# Altium footprint library BaseLib.PcbLib: 62 footprints (part 2 of 4)
Each footprint in its own frame and in the unit in brackets; x right, y up, seen from the top. Pads: shape width x height; smd on the part's side, far side on the other; paste and mask are expansions set on the pad; w line width, h text height; cw(c..) or ccw(c..) is an arc to the next point about the centre after c.
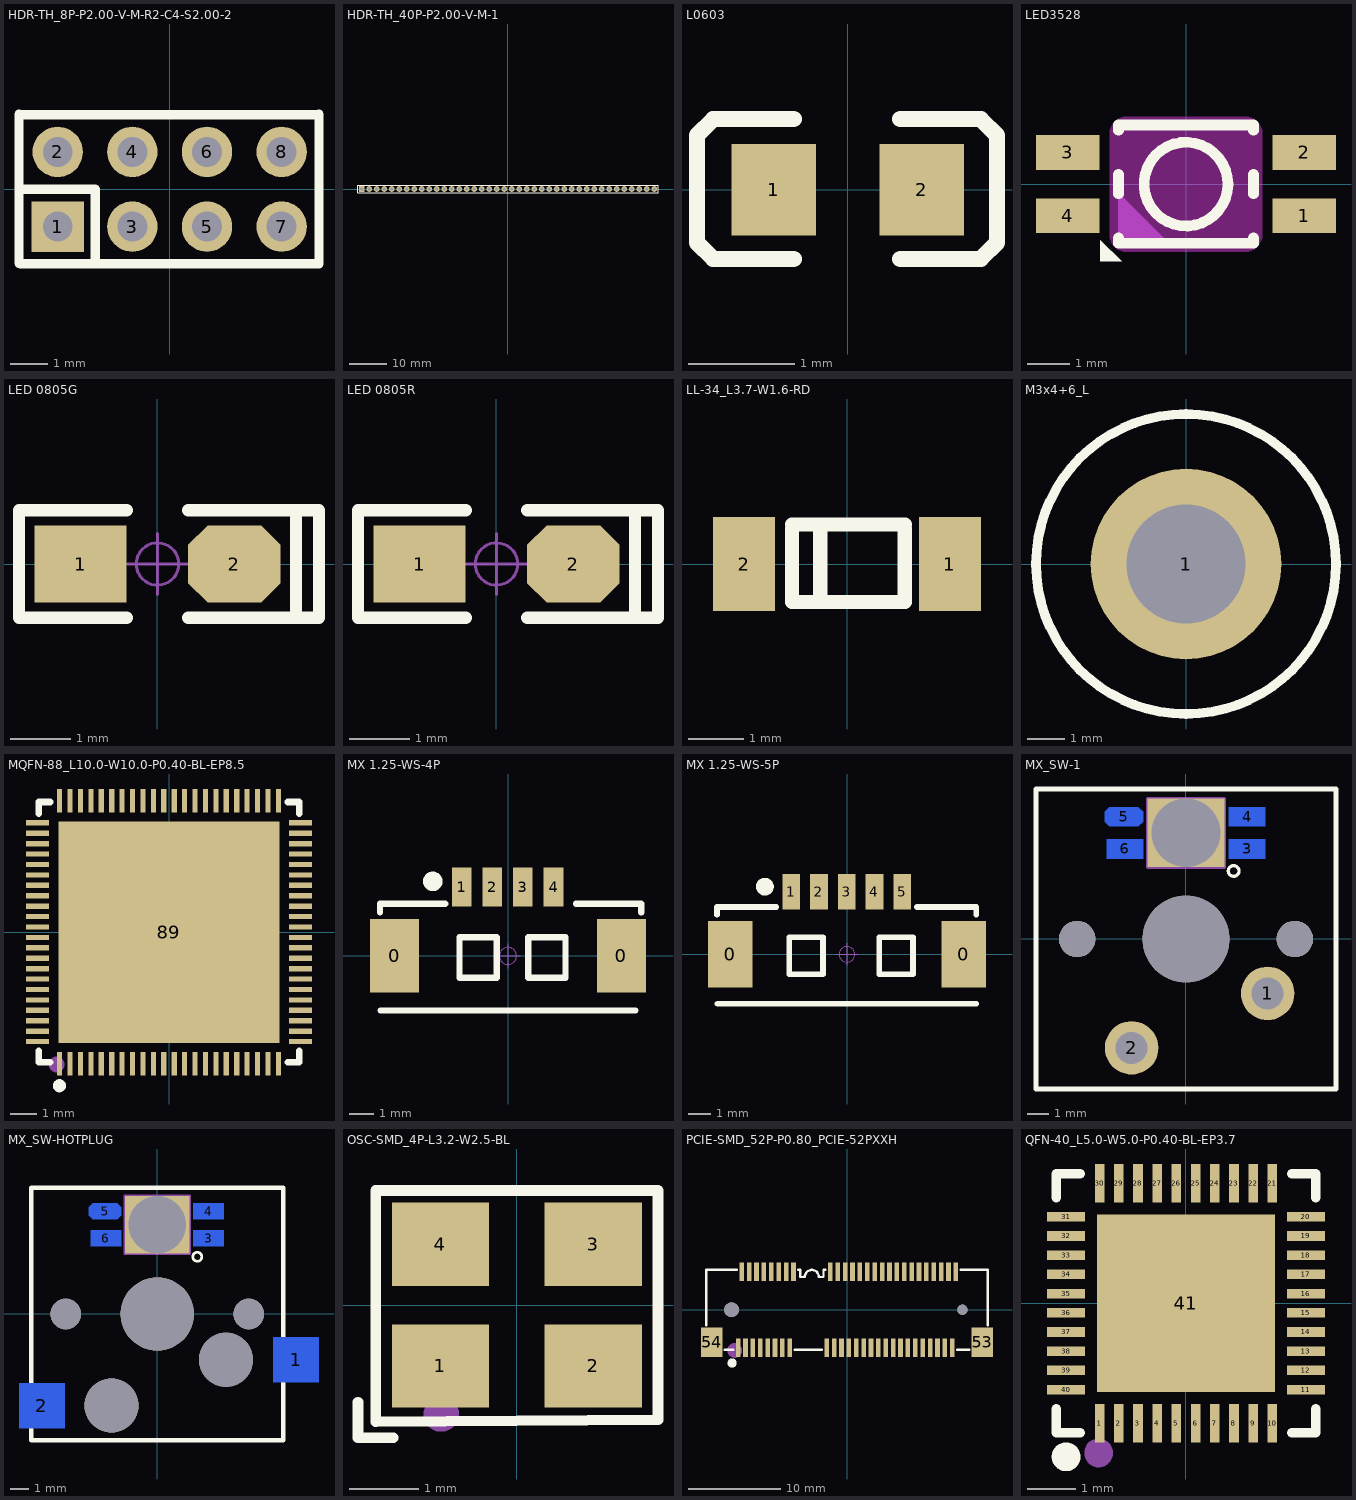
[diagram p1: the footprints below, top view; thin cyan lines are the x and y axes]

## HDR-TH_8P-P2.00-V-M-R2-C4-S2.00-2 [mm]
pads (8):
  rect 1.4x1.35 hole 0.8: 1(-3,-1)
  round 1.35 hole 0.8: 2(-3,1) 3(-1,-1) 4(-1,1) 5(1,-1) 6(1,1) 7(3,-1) 8(3,1)
Top Overlay:
  lines w0.254: -4.038,-1.989 -4.038,2.011 ; -4,-1.999 4,-1.999 ; -4,0 -2,0 -2,-1.999 ; -4,2 4,2 ; 4,-1.991 4,2.009

## HDR-TH_40P-P2.00-V-M-1 [mil]
pads (40):
  rect 60x60 hole 36: 1(-1535.43,0)
  round 60 hole 36: 2(-1456.69,0) 3(-1377.95,0) 4(-1299.21,0) 5(-1220.47,0) 6(-1141.73,0) 7(-1062.99,0) 8(-984.25,0) 9(-905.51,0) 10(-826.77,0) 11(-748.03,0) 12(-669.29,0) 13(-590.55,0) 14(-511.81,0) 15(-433.07,0) 16(-354.33,0) 17(-275.59,0) 18(-196.85,0) 19(-118.11,0) 20(-39.37,0) 21(39.37,0) 22(118.11,0) 23(196.85,0) 24(275.59,0) 25(354.33,0) 26(433.07,0) 27(511.81,0) 28(590.55,0) 29(669.29,0) 30(748.03,0) 31(826.77,0) 32(905.51,0) 33(984.25,0) 34(1062.99,0) 35(1141.73,0) 36(1220.47,0) 37(1299.21,0) 38(1377.95,0) 39(1456.69,0) 40(1535.43,0)
Top Overlay:
  lines w10: -1574.8,-39.37 -1574.8,39.37 1574.81,39.37 1574.81,-39.37 -1574.8,-39.37

## L0603 [mm]
pads (2):
  rect 0.8x0.864 smd: 1(-0.7,0) 2(0.7,0)
Top Overlay:
  lines w0.152: -0.51,-0.651 -1.272,-0.651 -1.424,-0.499 -1.424,0.517 -1.272,0.67 -0.51,0.67 ; 0.496,-0.651 1.258,-0.651 1.411,-0.499 1.411,0.517 1.258,0.67 0.496,0.67
Top Paste:
  region: -0.252,0.143 -0.252,-0.134 -0.526,-0.427 -1.029,-0.427 -1.093,-0.363 -1.093,0.373 -1.029,0.437 -0.526,0.437
  region: 0.264,0.154 0.264,-0.122 0.538,-0.416 1.042,-0.416 1.106,-0.352 1.106,0.384 1.042,0.448 0.538,0.448

## LED3528 [mm]
pads (4):
  rect 1.5x0.82 smd: 1(2.8,-0.75) 2(2.8,0.75) 3(-2.8,0.75) 4(-2.8,-0.75)
Top Overlay:
  circle w0.254: c0,0 r0.992
  region: -2.03,-1.83 -2.03,-1.322 -1.522,-1.83
  lines w0.254: -1.6,-1.273 -1.6,-1.4 1.6,-1.4 1.6,-1.273 ; -1.6,-0.227 -1.6,0.227 ; -1.6,1.273 -1.6,1.4 1.6,1.4 1.6,1.273 ; 1.6,-0.227 1.6,0.227
Keep-Out Layer:
  board cut-out: -1.4,-1.6 -1.413,-1.6 -1.412,-1.6 -1.41,-1.6 -1.409,-1.6 -1.407,-1.6 -1.406,-1.6 -1.404,-1.6 -1.402,-1.6 -1.401,-1.6
  board cut-out: 1.8,-1.2 1.8,-1.28 1.739,-1.427 1.627,-1.539 1.48,-1.6 1.4,-1.6 -1.4,-1.6 -1.401,-1.6 -1.402,-1.6 -1.404,-1.6 -1.406,-1.6 -1.485,-1.599 -1.63,-1.537 -1.74,-1.425 -1.8,-1.279 -1.8,-1.2 -1.8,1.2 -1.8,1.28 -1.739,1.427 -1.627,1.539 -1.48,1.6 -1.4,1.6 1.4,1.6 1.48,1.6 1.627,1.539 1.739,1.427 1.8,1.28 1.8,1.2
Mechanical 15:
  region: -1.6,-1.4 -0.4,-1.4 -1.6,-0.2

## LED 0805G [mil] "绿色0805LED                              淘宝ID:黄晶宝石"
height 177.17
pads (2):
  rect 60x50 smd: 1(-50,0)
  oct 60x50 smd: 2(50,0)
Top Overlay:
  lines w8: -20,-35 -90,-35 -90,35 -20,35 ; 20,-35 105,-35 105,35 20,35 ; 90,-35 90,35
Mechanical 15:
  circle w1.97: c0,0 r13.78
  lines w1.97: -19.68,0 19.68,0 ; 0,-19.68 0,19.68
3D body "LED 0805-G.STEP": height 26.33, standoff -0.16, extent -39.37,-24.65 39.37,24.65
3D body "LED 0805玻璃罩.ST": height 0, standoff 0, extent 0,0 0,0

## LED 0805R [mil] "红色0805LED                                       淘宝ID:黄晶宝石"
height 393.7
pads (2):
  rect 60x50 smd: 1(-50,0)
  oct 60x50 smd: 2(50,0)
Top Overlay:
  lines w8: -20,-35 -90,-35 -90,35 -20,35 ; 20,-35 105,-35 105,35 20,35 ; 90,-35 90,35
Mechanical 15:
  circle w1.97: c0,0 r13.78
  lines w1.97: -19.68,0 19.68,0 ; 0,-19.68 0,19.68
3D body "LED 0805-R.STEP": height 26.33, standoff -0.16, extent -39.37,-24.65 39.37,24.64
3D body "LED 0805玻璃罩.ST": height 31.69, standoff 12.01, extent -29.49,-25 29.49,24.29

## LL-34_L3.7-W1.6-RD [mil]
pads (2):
  rect 44x67 smd: 1(73,0) 2(-73,0)
Top Overlay:
  lines w10: -39.16,-27 41.16,-27 ; -39.16,-24.8 -39.16,24.8 ; -39.16,28 41.16,28 ; -19,-24.8 -19,24.8 ; 41,-25 41,24.8
3D body "User Library-SOD80C-1.STEP": height 62.99, standoff 0, extent -67.83,-29 77.83,34

## M3x4+6_L [mm] "M3铜柱，长：4mm，螺纹长：6mm"
height 10
pads (1):
  round 5.08 hole 3.175: 1(0,0)
Top Overlay:
  circle w0.254: c0,0 r4
3D body "M3x4+6.STEP": height 4.05, standoff -5.95, extent -2.698,-2.35 2.698,2.35

## MQFN-88_L10.0-W10.0-P0.40-BL-EP8.5 [mm]
pads (89):
  rect 0.2x0.9 smd: 1(-4.2,-5.05) 2(-3.8,-5.05) 3(-3.4,-5.05) 4(-3,-5.05) 5(-2.6,-5.05) 6(-2.2,-5.05) 7(-1.8,-5.05) 8(-1.4,-5.05) 9(-1,-5.05) 10(-0.6,-5.05) 11(-0.2,-5.05) 12(0.2,-5.05) 13(0.6,-5.05) 14(1,-5.05) 15(1.4,-5.05) 16(1.8,-5.05) 17(2.2,-5.05) 18(2.6,-5.05) 19(3,-5.05) 20(3.4,-5.05) 21(3.8,-5.05) 22(4.2,-5.05) 45(4.2,5.05) 46(3.8,5.05) 47(3.4,5.05) 48(3,5.05) 49(2.6,5.05) 50(2.2,5.05) 51(1.8,5.05) 52(1.4,5.05) 53(1,5.05) 54(0.6,5.05) 55(0.2,5.05) 56(-0.2,5.05) 57(-0.6,5.05) 58(-1,5.05) 59(-1.4,5.05) 60(-1.8,5.05) 61(-2.2,5.05) 62(-2.6,5.05) 63(-3,5.05) 64(-3.4,5.05) 65(-3.8,5.05) 66(-4.2,5.05)
  rect 0.9x0.2 smd: 23(5.05,-4.2) 24(5.05,-3.8) 25(5.05,-3.4) 26(5.05,-3) 27(5.05,-2.6) 28(5.05,-2.2) 29(5.05,-1.8) 30(5.05,-1.4) 31(5.05,-1) 32(5.05,-0.6) 33(5.05,-0.2) 34(5.05,0.2) 35(5.05,0.6) 36(5.05,1) 37(5.05,1.4) 38(5.05,1.8) 39(5.05,2.2) 40(5.05,2.6) 41(5.05,3) 42(5.05,3.4) 43(5.05,3.8) 44(5.05,4.2) 67(-5.05,4.2) 68(-5.05,3.8) 69(-5.05,3.4) 70(-5.05,3) 71(-5.05,2.6) 72(-5.05,2.2) 73(-5.05,1.8) 74(-5.05,1.4) 75(-5.05,1) 76(-5.05,0.6) 77(-5.05,0.2) 78(-5.05,-0.2) 79(-5.05,-0.6) 80(-5.05,-1) 81(-5.05,-1.4) 82(-5.05,-1.8) 83(-5.05,-2.2) 84(-5.05,-2.6) 85(-5.05,-3) 86(-5.05,-3.4) 87(-5.05,-3.8) 88(-5.05,-4.2)
  rect 8.5x8.5 smd: 89(0,0)
Top Overlay:
  lines w0.25: -4.21,-5.77 ccw(c-4.21,-5.895) -4.199,-5.77
  lines w0.254: -5,-4.555 -5,-5 -4.555,-5 ; -5,4.556 -5,5 -4.555,5 ; 4.556,-5 5,-5 5,-4.555 ; 4.556,5 5,5 5,4.556
Mechanical 15:
  circle w0.3: c-4.318,-5.08 r0.15

## MX 1.25-WS-4P [mm] "长：10.15mm，宽：4.2mm，高：3.4mm"
height 10
pads (6):
  rect 2x3 smd: 0(-4.632,0) 0(4.632,0)
  rect 0.8x1.6 smd: 1(-1.889,2.811) 2(-0.639,2.811) 3(0.611,2.811) 4(1.861,2.811)
Top Overlay:
  circle w0.4: c-3.074,3.048 r0.2
  lines w0.254: -5.233,1.778 -5.233,2.134 -2.566,2.134 ; -5.206,-2.228 5.201,-2.228 ; 2.782,2.134 5.449,2.134 5.449,1.778 ; -1.982,-0.889 -1.982,0.762 -0.458,0.762 -0.458,-0.889 -1.982,-0.889 ; 0.826,-0.889 0.826,0.762 2.35,0.762 2.35,-0.889 0.826,-0.889
Mechanical 15:
  circle w0.05: c0,0 r0.35
  lines w0.05: -0.5,0 0.5,0 ; 0,-0.5 0,0.5
3D body "MOLEX1.25-WS-4P.STEP": height 3.4, standoff 0, extent -5.075,-2.1 5.075,3.09

## MX 1.25-WS-5P [mm] "长：11.4mm，宽：4.2mm，高：3.4mm"
pads (7):
  rect 2x3 smd: 0(-5.257,0) 0(5.257,0)
  rect 0.8x1.6 smd: 1(-2.514,2.811) 2(-1.264,2.811) 3(-0.014,2.811) 4(1.236,2.811) 5(2.486,2.811)
Top Overlay:
  circle w0.4: c-3.699,3.048 r0.2
  lines w0.254: -5.858,1.778 -5.858,2.134 -3.191,2.134 ; -5.831,-2.228 5.826,-2.228 ; 3.153,2.134 5.82,2.134 5.82,1.778 ; -2.607,-0.889 -1.083,-0.889 -1.083,0.762 -2.607,0.762 -2.607,-0.889 ; 1.451,-0.889 2.975,-0.889 2.975,0.762 1.451,0.762 1.451,-0.889
Mechanical 15:
  circle w0.05: c0,0 r0.35
  lines w0.05: -0.5,0 0.5,0 ; 0,-0.5 0,0.5
3D body "MOLEX1.25-WS-5P.STEP": height 3.4, standoff 0, extent -5.7,-2.1 5.7,3.09

## MX_SW-1 [mm] "with Fixation pins  1-Pole w/Diode"
pads (10):
  round 2.5 hole 1.5: 1(3.81,-2.54) 2(-2.54,-5.08)
  rect 1.7x0.9 smd far side: 3(2.85,4.203) 4(2.85,5.703) 6(-2.85,4.203)
  oct 1.8x0.9 smd far side: 5(-2.9,5.703)
  round 1.702 hole 1.702: ""(-5.08,0) ""(5.08,0)
  round 4.064 hole 4.064: ""(0,0)
  rect 3.6x3.2 hole 3.2 square: ""(0,4.953)
Top Overlay:
  circle w0.15: c2.222,3.175 r0.25
  lines w0.254: -7,-7 7,-7 7,7 -7,7 -7,-7
Mechanical 1:
  lines w0.15: -1.8,3.353 1.8,3.353 1.8,6.553 -1.8,6.553 -1.8,3.353
3D body "MX .STEP": height 15.4, standoff -3.5, extent -7.853,-7.8 7.747,7.8
3D body "User Library-Led_3528_SingleColor.STEP": height 1.39, standoff -0.51, extent -1.75,3.553 1.75,6.353

## MX_SW-HOTPLUG [mm] "with Fixation pins  1-Pole w/Diode"
pads (12):
  rect 2.55x2.5 smd far side: 1(7.7,-2.54) 2(-6.4,-5.08)
  rect 1.7x0.9 smd far side: 3(2.85,4.203) 4(2.85,5.703) 6(-2.85,4.203)
  oct 1.8x0.9 smd far side: 5(-2.9,5.703)
  round 1.702 hole 1.702: ""(-5.08,0) ""(5.08,0)
  round 3 hole 3: ""(-2.54,-5.08) ""(3.81,-2.54)
  round 4.064 hole 4.064: ""(0,0)
  rect 3.6x3.2 hole 3.2 square: ""(0,4.953)
Top Overlay:
  circle w0.15: c2.222,3.175 r0.25
  lines w0.254: -7,-7 -7,7 7,7 7,-7 -7,-7
Mechanical 1:
  lines w0.15: -1.8,3.353 -1.8,6.553 1.8,6.553 1.8,3.353 -1.8,3.353
3D body "User Library-cherry mx.SLDPRT": height 2.55, standoff -15.3, extent -7.82,-8.165 7.82,8.165
3D body "User Library-Led_3528_SingleColor.STEP": height 1.39, standoff -0.51, extent -1.75,3.553 1.75,6.353

## OSC-SMD_4P-L3.2-W2.5-BL [mm]
pads (4):
  rect 1.4x1.2 smd: 1(-1.1,-0.875) 2(1.1,-0.875) 3(1.1,0.875) 4(-1.1,0.875)
Top Overlay:
  lines w0.152: -2.286,-1.397 -2.286,-1.905 -1.778,-1.905 ; -2.029,-1.679 2.032,-1.651 2.032,0 2.032,1.651 -2.029,1.651 -2.029,-1.679
Mechanical 15:
  circle w0.254: c-1.088,-1.567 r0.127
  region: -1.738,-0.536 -1.702,-0.536 -1.702,-0.608 -1.738,-0.608
  region: -1.702,-0.536 -1.666,-0.536 -1.666,-0.608 -1.702,-0.608
  region: -1.666,-0.5 -1.63,-0.5 -1.63,-0.608 -1.666,-0.608
  region: -1.63,-0.464 -1.594,-0.464 -1.594,-0.572 -1.63,-0.572
  region: -1.594,-0.464 -1.558,-0.464 -1.558,-1.004 -1.594,-1.004
  region: -1.558,-0.428 -1.522,-0.428 -1.522,-1.004 -1.558,-1.004
  region: -1.522,-0.428 -1.486,-0.428 -1.486,-1.004 -1.522,-1.004
  region: -1.486,-0.428 -1.45,-0.428 -1.45,-1.004 -1.486,-1.004

## PCIE-SMD_52P-P0.80_PCIE-52PXXH [mm]
pads (56):
  rect 0.5x2 smd: 1(-11.8,-4.1) 2(-11.4,4.1) 3(-11,-4.1) 4(-10.6,4.1) 5(-10.2,-4.1) 6(-9.8,4.1) 7(-9.4,-4.1) 8(-9,4.1) 9(-8.6,-4.1) 10(-8.2,4.1) 11(-7.8,-4.1) 12(-7.4,4.1) 13(-7,-4.1) 14(-6.6,4.1) 15(-6.2,-4.1) 16(-5.8,4.1) 17(-2.2,-4.1) 18(-1.8,4.1) 19(-1.4,-4.1) 20(-1,4.1) 21(-0.6,-4.1) 22(-0.2,4.1) 23(0.2,-4.1) 24(0.6,4.1) 25(1,-4.1) 26(1.4,4.1) 27(1.8,-4.1) 28(2.2,4.1) 29(2.6,-4.1) 30(3,4.1) 31(3.4,-4.1) 32(3.8,4.1) 33(4.2,-4.1) 34(4.6,4.1) 35(5,-4.1) 36(5.4,4.1) 37(5.8,-4.1) 38(6.2,4.1) 39(6.6,-4.1) 40(7,4.1) 41(7.4,-4.1) 42(7.8,4.1) 43(8.2,-4.1) 44(8.6,4.1) 45(9,-4.1) 46(9.4,4.1) 47(9.8,-4.1) 48(10.2,4.1) 49(10.6,-4.1) 50(11,4.1) 51(11.4,-4.1) 52(11.8,4.1)
  rect 2.3x3.2 smd: 53(14.65,-3.5) 54(-14.65,-3.5)
  round 1.6 hole 1.6 unplated: ""(-12.5,0)
  round 1.1 hole 1.1 unplated: ""(12.5,0)
Top Overlay:
  circle w0.5: c-12.45,-5.77 r0.25
  lines w0.254: -15.241,-1.669 -15.241,4.318 -14.987,4.318 -11.931,4.318 ; -13.269,-4.318 -12.331,-4.318 ; -5.669,-4.318 -2.731,-4.318 ; -5.269,4.318 -5.081,4.318 -5.081,3.556 -4.573,3.556 cw(c-3.81,3.556) -3.048,3.556 -2.54,3.556 -2.54,4.318 -2.331,4.318 ; 11.931,-4.318 13.269,-4.318 ; 12.331,4.318 14.985,4.318 15.239,4.318 15.239,-1.669
Mechanical 15:
  circle w0.43: c12.5,0 r0.215
  circle w0.8: c-12.17,-4.4 r0.4
  region: -12.49,0.68 -12.579,0.68 -12.751,0.634 -12.905,0.545 -13.031,0.42 -13.12,0.266 -13.166,0.094 -13.166,-0.084 -13.12,-0.256 -13.031,-0.41 -12.905,-0.536 -12.751,-0.625 -12.579,-0.671 -12.49,-0.671 -12.491,-0.671

## QFN-40_L5.0-W5.0-P0.40-BL-EP3.7 [mm]
pads (41):
  rect 0.2x0.8 smd: 1(-1.8,-2.499) 2(-1.4,-2.499) 3(-1,-2.499) 4(-0.6,-2.499) 5(-0.2,-2.499) 6(0.2,-2.499) 7(0.6,-2.499) 8(1,-2.499) 9(1.4,-2.499) 10(1.8,-2.499) 21(1.8,2.499) 22(1.4,2.499) 23(1,2.499) 24(0.6,2.499) 25(0.2,2.499) 26(-0.2,2.499) 27(-0.6,2.499) 28(-1,2.499) 29(-1.4,2.499) 30(-1.8,2.499)
  rect 0.8x0.2 smd: 11(2.499,-1.8) 12(2.499,-1.4) 13(2.499,-1) 14(2.499,-0.6) 15(2.499,-0.2) 16(2.499,0.2) 17(2.499,0.6) 18(2.499,1) 19(2.499,1.4) 20(2.499,1.8) 31(-2.499,1.8) 32(-2.499,1.4) 33(-2.499,1) 34(-2.499,0.6) 35(-2.499,0.2) 36(-2.499,-0.2) 37(-2.499,-0.6) 38(-2.499,-1) 39(-2.499,-1.4) 40(-2.499,-1.8)
  rect 3.7x3.7 smd: 41(0,0)
Top Overlay:
  lines w0.2: -2.7,-2.2 -2.7,-2.7 -2.2,-2.7 ; -2.7,2.2 -2.7,2.7 -2.2,2.7 ; 2.2,-2.7 2.7,-2.7 2.7,-2.2 ; 2.2,2.7 2.7,2.7 2.7,2.2
  lines w0.3: -2.499,-3.051 ccw(c-2.498,-3.201) -2.497,-3.051
Top Paste:
  drawing of 41 lines, arcs and shapes, not listed
Mechanical 15:
  circle w0.3: c-1.82,-3.12 r0.15